# Altium footprint library Connector_Samtec_HLE_THT.PcbLib: 141 footprints (part 7 of 9) (continued)
## Samtec_HLE-138-02-xx-DV-PE_2x38_P2.54mm_Horizontal [mm]
pads (152):
  rrect19% 1.31x1.31 hole 0.71: 1(0,0)
  round 1.31 hole 0.71: 2(0,-7.62) 3(2.54,0) 4(2.54,-7.62) 5(5.08,0) 6(5.08,-7.62) 7(7.62,0) 8(7.62,-7.62) 9(10.16,0) 10(10.16,-7.62) 11(12.7,0) 12(12.7,-7.62) 13(15.24,0) 14(15.24,-7.62) 15(17.78,0) 16(17.78,-7.62) 17(20.32,0) 18(20.32,-7.62) 19(22.86,0) 20(22.86,-7.62) 21(25.4,0) 22(25.4,-7.62) 23(27.94,0) 24(27.94,-7.62) 25(30.48,0) 26(30.48,-7.62) 27(33.02,0) 28(33.02,-7.62) 29(35.56,0) 30(35.56,-7.62) 31(38.1,0) 32(38.1,-7.62) 33(40.64,0) 34(40.64,-7.62) 35(43.18,0) 36(43.18,-7.62) 37(45.72,0) 38(45.72,-7.62) 39(48.26,0) 40(48.26,-7.62) 41(50.8,0) 42(50.8,-7.62) 43(53.34,0) 44(53.34,-7.62) 45(55.88,0) 46(55.88,-7.62) 47(58.42,0) 48(58.42,-7.62) 49(60.96,0) 50(60.96,-7.62) 51(63.5,0) 52(63.5,-7.62) 53(66.04,0) 54(66.04,-7.62) 55(68.58,0) 56(68.58,-7.62) 57(71.12,0) 58(71.12,-7.62) 59(73.66,0) 60(73.66,-7.62) 61(76.2,0) 62(76.2,-7.62) 63(78.74,0) 64(78.74,-7.62) 65(81.28,0) 66(81.28,-7.62) 67(83.82,0) 68(83.82,-7.62) 69(86.36,0) 70(86.36,-7.62) 71(88.9,0) 72(88.9,-7.62) 73(91.44,0) 74(91.44,-7.62) 75(93.98,0) 76(93.98,-7.62)
  round 1.4 hole 1.4: Un1(60.96,-2.54) Un2(66.04,-5.08) Un3(17.78,-2.54) Un4(27.94,-2.54) Un5(53.34,-2.54) Un6(20.32,-5.08) Un7(40.64,-2.54) Un8(78.74,-2.54) Un9(35.56,-2.54) Un10(60.96,-5.08) Un11(93.98,-2.54) Un12(68.58,-2.54) Un13(22.86,-2.54) Un14(81.28,-5.08) Un15(22.86,-5.08) Un16(83.82,-2.54) Un17(27.94,-5.08) Un18(43.18,-2.54) Un19(53.34,-5.08) Un20(25.4,-2.54) Un21(2.54,-2.54) Un22(25.4,-5.08) Un23(10.16,-5.08) Un24(12.7,-5.08) Un25(15.24,-5.08) Un26(12.7,-2.54) Un27(45.72,-2.54) Un28(0,-5.08) Un29(30.48,-5.08) Un30(88.9,-5.08) Un31(93.98,-5.08) Un32(15.24,-2.54) Un33(68.58,-5.08) Un34(91.44,-2.54) Un35(17.78,-5.08) Un36(58.42,-5.08) Un37(48.26,-5.08) Un38(7.62,-5.08) Un39(66.04,-2.54) Un40(86.36,-5.08) Un41(63.5,-5.08) Un42(63.5,-2.54) Un43(78.74,-5.08) Un44(71.12,-2.54) Un45(71.12,-5.08) Un46(48.26,-2.54) Un47(86.36,-2.54) Un48(45.72,-5.08) Un49(76.2,-5.08) Un50(20.32,-2.54) Un51(5.08,-5.08) Un52(38.1,-2.54) Un53(43.18,-5.08) Un54(76.2,-2.54) Un55(55.88,-2.54) Un56(5.08,-2.54) Un57(0,-2.54) Un58(58.42,-2.54) Un59(40.64,-5.08) Un60(88.9,-2.54) Un61(38.1,-5.08) Un62(2.54,-5.08) Un63(50.8,-5.08) Un64(81.28,-2.54) Un65(35.56,-5.08) Un66(73.66,-5.08) Un67(50.8,-2.54) Un68(33.02,-2.54) Un69(30.48,-2.54) Un70(10.16,-2.54) Un71(55.88,-5.08) Un72(91.44,-5.08) Un73(7.62,-2.54) Un74(33.02,-5.08) Un75(83.82,-5.08) Un76(73.66,-2.54)
F.SilkS:
  lines w0.12: -1.38,-6.46 95.36,-6.46 95.36,-1.16 -1.38,-1.16 -1.38,-6.46
F.CrtYd:
  lines w0.05: -1.77,-8.78 95.75,-8.78 95.75,1.16 -1.77,1.16 -1.77,-8.78
F.Fab:
  lines w0.1: -0.5,-1.27 0,-1.977 0.5,-1.27 ; -1.27,-6.35 -1.27,-1.27 95.25,-1.27 95.25,-6.35 -1.27,-6.35
  text "'.Designator'" at 42.943,-6.49 h1

## Samtec_HLE-138-02-xx-DV-TE_2x38_P2.54mm_Horizontal [mm]
pads (76):
  rrect19% 1.31x1.31 hole 0.71: 1(0,0)
  round 1.31 hole 0.71: 2(0,-2.54) 3(2.54,0) 4(2.54,-2.54) 5(5.08,0) 6(5.08,-2.54) 7(7.62,0) 8(7.62,-2.54) 9(10.16,0) 10(10.16,-2.54) 11(12.7,0) 12(12.7,-2.54) 13(15.24,0) 14(15.24,-2.54) 15(17.78,0) 16(17.78,-2.54) 17(20.32,0) 18(20.32,-2.54) 19(22.86,0) 20(22.86,-2.54) 21(25.4,0) 22(25.4,-2.54) 23(27.94,0) 24(27.94,-2.54) 25(30.48,0) 26(30.48,-2.54) 27(33.02,0) 28(33.02,-2.54) 29(35.56,0) 30(35.56,-2.54) 31(38.1,0) 32(38.1,-2.54) 33(40.64,0) 34(40.64,-2.54) 35(43.18,0) 36(43.18,-2.54) 37(45.72,0) 38(45.72,-2.54) 39(48.26,0) 40(48.26,-2.54) 41(50.8,0) 42(50.8,-2.54) 43(53.34,0) 44(53.34,-2.54) 45(55.88,0) 46(55.88,-2.54) 47(58.42,0) 48(58.42,-2.54) 49(60.96,0) 50(60.96,-2.54) 51(63.5,0) 52(63.5,-2.54) 53(66.04,0) 54(66.04,-2.54) 55(68.58,0) 56(68.58,-2.54) 57(71.12,0) 58(71.12,-2.54) 59(73.66,0) 60(73.66,-2.54) 61(76.2,0) 62(76.2,-2.54) 63(78.74,0) 64(78.74,-2.54) 65(81.28,0) 66(81.28,-2.54) 67(83.82,0) 68(83.82,-2.54) 69(86.36,0) 70(86.36,-2.54) 71(88.9,0) 72(88.9,-2.54) 73(91.44,0) 74(91.44,-2.54) 75(93.98,0) 76(93.98,-2.54)
F.SilkS:
  lines w0.12: -1.38,-3.92 95.36,-3.92 95.36,1.38 -1.38,1.38 -1.38,-3.92
F.CrtYd:
  lines w0.05: -1.77,-4.31 95.75,-4.31 95.75,1.77 -1.77,1.77 -1.77,-4.31
F.Fab:
  lines w0.1: -0.5,1.27 0,0.563 0.5,1.27 ; -1.27,-3.81 -1.27,1.27 95.25,1.27 95.25,-3.81 -1.27,-3.81
  text "'.Designator'" at 42.943,-3.95 h1

## Samtec_HLE-139-02-xx-DV-PE-LC_2x39_P2.54mm_Horizontal [mm]
pads (158):
  rrect19% 1.31x1.31 hole 0.71: 1(0,0)
  round 1.31 hole 0.71: 2(0,-7.62) 3(2.54,0) 4(2.54,-7.62) 5(5.08,0) 6(5.08,-7.62) 7(7.62,0) 8(7.62,-7.62) 9(10.16,0) 10(10.16,-7.62) 11(12.7,0) 12(12.7,-7.62) 13(15.24,0) 14(15.24,-7.62) 15(17.78,0) 16(17.78,-7.62) 17(20.32,0) 18(20.32,-7.62) 19(22.86,0) 20(22.86,-7.62) 21(25.4,0) 22(25.4,-7.62) 23(27.94,0) 24(27.94,-7.62) 25(30.48,0) 26(30.48,-7.62) 27(33.02,0) 28(33.02,-7.62) 29(35.56,0) 30(35.56,-7.62) 31(38.1,0) 32(38.1,-7.62) 33(40.64,0) 34(40.64,-7.62) 35(43.18,0) 36(43.18,-7.62) 37(45.72,0) 38(45.72,-7.62) 39(48.26,0) 40(48.26,-7.62) 41(50.8,0) 42(50.8,-7.62) 43(53.34,0) 44(53.34,-7.62) 45(55.88,0) 46(55.88,-7.62) 47(58.42,0) 48(58.42,-7.62) 49(60.96,0) 50(60.96,-7.62) 51(63.5,0) 52(63.5,-7.62) 53(66.04,0) 54(66.04,-7.62) 55(68.58,0) 56(68.58,-7.62) 57(71.12,0) 58(71.12,-7.62) 59(73.66,0) 60(73.66,-7.62) 61(76.2,0) 62(76.2,-7.62) 63(78.74,0) 64(78.74,-7.62) 65(81.28,0) 66(81.28,-7.62) 67(83.82,0) 68(83.82,-7.62) 69(86.36,0) 70(86.36,-7.62) 71(88.9,0) 72(88.9,-7.62) 73(91.44,0) 74(91.44,-7.62) 75(93.98,0) 76(93.98,-7.62) 77(96.52,0) 78(96.52,-7.62)
  round 1.4 hole 1.4: Un1(73.66,-5.08) Un2(40.64,-5.08) Un3(55.88,-5.08) Un4(50.8,-5.08) Un5(76.2,-5.08) Un6(17.78,-2.54) Un7(66.04,-5.08) Un8(10.16,-5.08) Un9(20.32,-2.54) Un10(43.18,-2.54) Un11(35.56,-2.54) Un12(63.5,-5.08) Un13(45.72,-5.08) Un14(5.08,-2.54) Un15(71.12,-2.54) Un16(25.4,-5.08) Un17(81.28,-2.54) Un18(2.54,-2.54) Un19(91.44,-5.08) Un20(78.74,-2.54) Un21(2.54,-5.08) Un22(25.4,-2.54) Un23(5.08,-5.08) Un24(71.12,-5.08) Un25(10.16,-2.54) Un26(73.66,-2.54) Un27(12.7,-5.08) Un28(55.88,-2.54) Un29(7.62,-2.54) Un30(78.74,-5.08) Un31(60.96,-5.08) Un32(30.48,-5.08) Un33(15.24,-5.08) Un34(83.82,-5.08) Un35(38.1,-5.08) Un36(60.96,-2.54) Un37(45.72,-2.54) Un38(33.02,-2.54) Un39(83.82,-2.54) Un40(43.18,-5.08) Un41(53.34,-2.54) Un42(0,-2.54) Un43(68.58,-2.54) Un44(48.26,-5.08) Un45(27.94,-5.08) Un46(53.34,-5.08) Un47(58.42,-5.08) Un48(17.78,-5.08) Un49(58.42,-2.54) Un50(88.9,-2.54) Un51(50.8,-2.54) Un52(86.36,-5.08) Un53(40.64,-2.54) Un54(0,-5.08) Un55(96.52,-5.08) Un56(76.2,-2.54) Un57(96.52,-2.54) Un58(88.9,-5.08) Un59(30.48,-2.54) Un61(68.58,-5.08) Un62(7.62,-5.08) Un63(15.24,-2.54) Un65(38.1,-2.54) Un66(81.28,-5.08) Un67(48.26,-2.54) Un68(63.5,-2.54) Un69(20.32,-5.08) Un70(33.02,-5.08) Un71(27.94,-2.54) Un72(22.86,-2.54) Un73(93.98,-2.54) Un74(93.98,-5.08) Un75(66.04,-2.54) Un76(91.44,-2.54) Un77(22.86,-5.08) Un78(86.36,-2.54) Un79(12.7,-2.54) Un80(35.56,-5.08)
  round 1.19 hole 1.19: Un60(95.25,-3.81) Un64(1.27,-3.81)
F.SilkS:
  lines w0.12: -1.38,-6.46 97.9,-6.46 97.9,-1.16 -1.38,-1.16 -1.38,-6.46
F.CrtYd:
  lines w0.05: -1.77,-8.78 -1.77,1.16 98.29,1.16 98.29,-8.78 -1.77,-8.78
F.Fab:
  lines w0.1: -0.5,-1.27 0,-1.977 0.5,-1.27 ; -1.27,-6.35 -1.27,-1.27 97.79,-1.27 97.79,-6.35 -1.27,-6.35
  text "'.Designator'" at 44.213,-6.49 h1

## Samtec_HLE-139-02-xx-DV-PE_2x39_P2.54mm_Horizontal [mm]
pads (156):
  rrect19% 1.31x1.31 hole 0.71: 1(0,0)
  round 1.31 hole 0.71: 2(0,-7.62) 3(2.54,0) 4(2.54,-7.62) 5(5.08,0) 6(5.08,-7.62) 7(7.62,0) 8(7.62,-7.62) 9(10.16,0) 10(10.16,-7.62) 11(12.7,0) 12(12.7,-7.62) 13(15.24,0) 14(15.24,-7.62) 15(17.78,0) 16(17.78,-7.62) 17(20.32,0) 18(20.32,-7.62) 19(22.86,0) 20(22.86,-7.62) 21(25.4,0) 22(25.4,-7.62) 23(27.94,0) 24(27.94,-7.62) 25(30.48,0) 26(30.48,-7.62) 27(33.02,0) 28(33.02,-7.62) 29(35.56,0) 30(35.56,-7.62) 31(38.1,0) 32(38.1,-7.62) 33(40.64,0) 34(40.64,-7.62) 35(43.18,0) 36(43.18,-7.62) 37(45.72,0) 38(45.72,-7.62) 39(48.26,0) 40(48.26,-7.62) 41(50.8,0) 42(50.8,-7.62) 43(53.34,0) 44(53.34,-7.62) 45(55.88,0) 46(55.88,-7.62) 47(58.42,0) 48(58.42,-7.62) 49(60.96,0) 50(60.96,-7.62) 51(63.5,0) 52(63.5,-7.62) 53(66.04,0) 54(66.04,-7.62) 55(68.58,0) 56(68.58,-7.62) 57(71.12,0) 58(71.12,-7.62) 59(73.66,0) 60(73.66,-7.62) 61(76.2,0) 62(76.2,-7.62) 63(78.74,0) 64(78.74,-7.62) 65(81.28,0) 66(81.28,-7.62) 67(83.82,0) 68(83.82,-7.62) 69(86.36,0) 70(86.36,-7.62) 71(88.9,0) 72(88.9,-7.62) 73(91.44,0) 74(91.44,-7.62) 75(93.98,0) 76(93.98,-7.62) 77(96.52,0) 78(96.52,-7.62)
  round 1.4 hole 1.4: Un1(55.88,-2.54) Un2(50.8,-2.54) Un3(78.74,-2.54) Un4(96.52,-2.54) Un5(76.2,-5.08) Un6(7.62,-2.54) Un7(15.24,-5.08) Un8(25.4,-2.54) Un9(91.44,-2.54) Un10(83.82,-5.08) Un11(45.72,-2.54) Un12(15.24,-2.54) Un13(12.7,-5.08) Un14(86.36,-5.08) Un15(7.62,-5.08) Un16(27.94,-2.54) Un17(88.9,-5.08) Un18(71.12,-2.54) Un19(0,-2.54) Un20(73.66,-2.54) Un21(43.18,-2.54) Un22(12.7,-2.54) Un23(71.12,-5.08) Un24(81.28,-2.54) Un25(96.52,-5.08) Un26(38.1,-5.08) Un27(76.2,-2.54) Un28(66.04,-2.54) Un29(78.74,-5.08) Un30(25.4,-5.08) Un31(22.86,-2.54) Un32(10.16,-2.54) Un33(63.5,-5.08) Un34(53.34,-5.08) Un35(35.56,-5.08) Un36(40.64,-5.08) Un37(17.78,-2.54) Un38(60.96,-2.54) Un39(73.66,-5.08) Un40(48.26,-2.54) Un41(33.02,-5.08) Un42(17.78,-5.08) Un43(68.58,-5.08) Un44(55.88,-5.08) Un45(88.9,-2.54) Un46(58.42,-5.08) Un47(22.86,-5.08) Un48(2.54,-2.54) Un49(33.02,-2.54) Un50(66.04,-5.08) Un51(5.08,-2.54) Un52(20.32,-2.54) Un53(48.26,-5.08) Un54(38.1,-2.54) Un55(91.44,-5.08) Un56(60.96,-5.08) Un57(35.56,-2.54) Un58(93.98,-2.54) Un59(40.64,-2.54) Un60(58.42,-2.54) Un61(20.32,-5.08) Un62(50.8,-5.08) Un63(43.18,-5.08) Un64(45.72,-5.08) Un65(30.48,-2.54) Un66(10.16,-5.08) Un67(5.08,-5.08) Un68(27.94,-5.08) Un69(83.82,-2.54) Un70(68.58,-2.54) Un71(30.48,-5.08) Un72(53.34,-2.54) Un73(63.5,-2.54) Un74(86.36,-2.54) Un75(93.98,-5.08) Un76(0,-5.08) Un77(2.54,-5.08) Un78(81.28,-5.08)
F.SilkS:
  lines w0.12: -1.38,-6.46 97.9,-6.46 97.9,-1.16 -1.38,-1.16 -1.38,-6.46
F.CrtYd:
  lines w0.05: -1.77,-8.78 -1.77,1.16 98.29,1.16 98.29,-8.78 -1.77,-8.78
F.Fab:
  lines w0.1: -0.5,-1.27 0,-1.977 0.5,-1.27 ; -1.27,-6.35 97.79,-6.35 97.79,-1.27 -1.27,-1.27 -1.27,-6.35
  text "'.Designator'" at 44.213,-6.49 h1

## Samtec_HLE-139-02-xx-DV-TE_2x39_P2.54mm_Horizontal [mm]
pads (78):
  rrect19% 1.31x1.31 hole 0.71: 1(0,0)
  round 1.31 hole 0.71: 2(0,-2.54) 3(2.54,0) 4(2.54,-2.54) 5(5.08,0) 6(5.08,-2.54) 7(7.62,0) 8(7.62,-2.54) 9(10.16,0) 10(10.16,-2.54) 11(12.7,0) 12(12.7,-2.54) 13(15.24,0) 14(15.24,-2.54) 15(17.78,0) 16(17.78,-2.54) 17(20.32,0) 18(20.32,-2.54) 19(22.86,0) 20(22.86,-2.54) 21(25.4,0) 22(25.4,-2.54) 23(27.94,0) 24(27.94,-2.54) 25(30.48,0) 26(30.48,-2.54) 27(33.02,0) 28(33.02,-2.54) 29(35.56,0) 30(35.56,-2.54) 31(38.1,0) 32(38.1,-2.54) 33(40.64,0) 34(40.64,-2.54) 35(43.18,0) 36(43.18,-2.54) 37(45.72,0) 38(45.72,-2.54) 39(48.26,0) 40(48.26,-2.54) 41(50.8,0) 42(50.8,-2.54) 43(53.34,0) 44(53.34,-2.54) 45(55.88,0) 46(55.88,-2.54) 47(58.42,0) 48(58.42,-2.54) 49(60.96,0) 50(60.96,-2.54) 51(63.5,0) 52(63.5,-2.54) 53(66.04,0) 54(66.04,-2.54) 55(68.58,0) 56(68.58,-2.54) 57(71.12,0) 58(71.12,-2.54) 59(73.66,0) 60(73.66,-2.54) 61(76.2,0) 62(76.2,-2.54) 63(78.74,0) 64(78.74,-2.54) 65(81.28,0) 66(81.28,-2.54) 67(83.82,0) 68(83.82,-2.54) 69(86.36,0) 70(86.36,-2.54) 71(88.9,0) 72(88.9,-2.54) 73(91.44,0) 74(91.44,-2.54) 75(93.98,0) 76(93.98,-2.54) 77(96.52,0) 78(96.52,-2.54)
F.SilkS:
  lines w0.12: -1.38,-3.92 97.9,-3.92 97.9,1.38 -1.38,1.38 -1.38,-3.92
F.CrtYd:
  lines w0.05: -1.77,-4.31 98.29,-4.31 98.29,1.77 -1.77,1.77 -1.77,-4.31
F.Fab:
  lines w0.1: -0.5,1.27 0,0.563 0.5,1.27 ; -1.27,-3.81 -1.27,1.27 97.79,1.27 97.79,-3.81 -1.27,-3.81
  text "'.Designator'" at 44.213,-3.95 h1

## Samtec_HLE-140-02-xx-DV-PE-LC_2x40_P2.54mm_Horizontal [mm]
pads (162):
  rrect19% 1.31x1.31 hole 0.71: 1(0,0)
  round 1.31 hole 0.71: 2(0,-7.62) 3(2.54,0) 4(2.54,-7.62) 5(5.08,0) 6(5.08,-7.62) 7(7.62,0) 8(7.62,-7.62) 9(10.16,0) 10(10.16,-7.62) 11(12.7,0) 12(12.7,-7.62) 13(15.24,0) 14(15.24,-7.62) 15(17.78,0) 16(17.78,-7.62) 17(20.32,0) 18(20.32,-7.62) 19(22.86,0) 20(22.86,-7.62) 21(25.4,0) 22(25.4,-7.62) 23(27.94,0) 24(27.94,-7.62) 25(30.48,0) 26(30.48,-7.62) 27(33.02,0) 28(33.02,-7.62) 29(35.56,0) 30(35.56,-7.62) 31(38.1,0) 32(38.1,-7.62) 33(40.64,0) 34(40.64,-7.62) 35(43.18,0) 36(43.18,-7.62) 37(45.72,0) 38(45.72,-7.62) 39(48.26,0) 40(48.26,-7.62) 41(50.8,0) 42(50.8,-7.62) 43(53.34,0) 44(53.34,-7.62) 45(55.88,0) 46(55.88,-7.62) 47(58.42,0) 48(58.42,-7.62) 49(60.96,0) 50(60.96,-7.62) 51(63.5,0) 52(63.5,-7.62) 53(66.04,0) 54(66.04,-7.62) 55(68.58,0) 56(68.58,-7.62) 57(71.12,0) 58(71.12,-7.62) 59(73.66,0) 60(73.66,-7.62) 61(76.2,0) 62(76.2,-7.62) 63(78.74,0) 64(78.74,-7.62) 65(81.28,0) 66(81.28,-7.62) 67(83.82,0) 68(83.82,-7.62) 69(86.36,0) 70(86.36,-7.62) 71(88.9,0) 72(88.9,-7.62) 73(91.44,0) 74(91.44,-7.62) 75(93.98,0) 76(93.98,-7.62) 77(96.52,0) 78(96.52,-7.62) 79(99.06,0) 80(99.06,-7.62)
  round 1.4 hole 1.4: Un1(15.24,-5.08) Un2(83.82,-5.08) Un3(12.7,-2.54) Un4(10.16,-2.54) Un5(86.36,-2.54) Un6(81.28,-5.08) Un7(63.5,-5.08) Un8(99.06,-2.54) Un9(33.02,-2.54) Un10(12.7,-5.08) Un11(88.9,-2.54) Un12(78.74,-2.54) Un13(2.54,-2.54) Un14(53.34,-2.54) Un15(58.42,-2.54) Un16(81.28,-2.54) Un17(22.86,-5.08) Un18(66.04,-5.08) Un19(60.96,-5.08) Un20(71.12,-2.54) Un21(99.06,-5.08) Un22(91.44,-5.08) Un23(93.98,-5.08) Un24(78.74,-5.08) Un25(73.66,-2.54) Un26(5.08,-2.54) Un27(27.94,-2.54) Un28(30.48,-2.54) Un29(96.52,-2.54) Un30(0,-2.54) Un31(58.42,-5.08) Un32(40.64,-2.54) Un33(53.34,-5.08) Un34(83.82,-2.54) Un35(76.2,-2.54) Un36(76.2,-5.08) Un37(7.62,-2.54) Un38(20.32,-2.54) Un39(68.58,-2.54) Un41(22.86,-2.54) Un42(5.08,-5.08) Un44(27.94,-5.08) Un45(25.4,-5.08) Un46(45.72,-2.54) Un47(17.78,-2.54) Un48(96.52,-5.08) Un49(10.16,-5.08) Un50(73.66,-5.08) Un51(91.44,-2.54) Un52(38.1,-5.08) Un53(17.78,-5.08) Un54(55.88,-2.54) Un55(50.8,-2.54) Un56(38.1,-2.54) Un57(0,-5.08) Un58(55.88,-5.08) Un59(48.26,-5.08) Un60(40.64,-5.08) Un61(86.36,-5.08) Un62(48.26,-2.54) Un63(25.4,-2.54) Un64(35.56,-5.08) Un65(60.96,-2.54) Un66(71.12,-5.08) Un67(15.24,-2.54) Un68(30.48,-5.08) Un69(2.54,-5.08) Un70(50.8,-5.08) Un71(43.18,-2.54) Un72(63.5,-2.54) Un73(68.58,-5.08) Un74(66.04,-2.54) Un75(35.56,-2.54) Un76(33.02,-5.08) Un77(88.9,-5.08) Un78(93.98,-2.54) Un79(45.72,-5.08) Un80(20.32,-5.08) Un81(43.18,-5.08) Un82(7.62,-5.08)
  round 1.19 hole 1.19: Un40(1.27,-3.81) Un43(97.79,-3.81)
F.SilkS:
  lines w0.12: -1.38,-6.46 100.44,-6.46 100.44,-1.16 -1.38,-1.16 -1.38,-6.46
F.CrtYd:
  lines w0.05: -1.77,-8.78 100.83,-8.78 100.83,1.16 -1.77,1.16 -1.77,-8.78
F.Fab:
  lines w0.1: -0.5,-1.27 0,-1.977 0.5,-1.27 ; -1.27,-6.35 100.33,-6.35 100.33,-1.27 -1.27,-1.27 -1.27,-6.35
  text "'.Designator'" at 45.483,-6.49 h1

## Samtec_HLE-140-02-xx-DV-PE_2x40_P2.54mm_Horizontal [mm]
pads (160):
  rrect19% 1.31x1.31 hole 0.71: 1(0,0)
  round 1.31 hole 0.71: 2(0,-7.62) 3(2.54,0) 4(2.54,-7.62) 5(5.08,0) 6(5.08,-7.62) 7(7.62,0) 8(7.62,-7.62) 9(10.16,0) 10(10.16,-7.62) 11(12.7,0) 12(12.7,-7.62) 13(15.24,0) 14(15.24,-7.62) 15(17.78,0) 16(17.78,-7.62) 17(20.32,0) 18(20.32,-7.62) 19(22.86,0) 20(22.86,-7.62) 21(25.4,0) 22(25.4,-7.62) 23(27.94,0) 24(27.94,-7.62) 25(30.48,0) 26(30.48,-7.62) 27(33.02,0) 28(33.02,-7.62) 29(35.56,0) 30(35.56,-7.62) 31(38.1,0) 32(38.1,-7.62) 33(40.64,0) 34(40.64,-7.62) 35(43.18,0) 36(43.18,-7.62) 37(45.72,0) 38(45.72,-7.62) 39(48.26,0) 40(48.26,-7.62) 41(50.8,0) 42(50.8,-7.62) 43(53.34,0) 44(53.34,-7.62) 45(55.88,0) 46(55.88,-7.62) 47(58.42,0) 48(58.42,-7.62) 49(60.96,0) 50(60.96,-7.62) 51(63.5,0) 52(63.5,-7.62) 53(66.04,0) 54(66.04,-7.62) 55(68.58,0) 56(68.58,-7.62) 57(71.12,0) 58(71.12,-7.62) 59(73.66,0) 60(73.66,-7.62) 61(76.2,0) 62(76.2,-7.62) 63(78.74,0) 64(78.74,-7.62) 65(81.28,0) 66(81.28,-7.62) 67(83.82,0) 68(83.82,-7.62) 69(86.36,0) 70(86.36,-7.62) 71(88.9,0) 72(88.9,-7.62) 73(91.44,0) 74(91.44,-7.62) 75(93.98,0) 76(93.98,-7.62) 77(96.52,0) 78(96.52,-7.62) 79(99.06,0) 80(99.06,-7.62)
  round 1.4 hole 1.4: Un1(7.62,-2.54) Un2(83.82,-5.08) Un3(93.98,-5.08) Un4(27.94,-5.08) Un5(33.02,-2.54) Un6(22.86,-5.08) Un7(83.82,-2.54) Un8(60.96,-5.08) Un9(17.78,-2.54) Un10(20.32,-5.08) Un11(63.5,-5.08) Un12(71.12,-2.54) Un13(55.88,-5.08) Un14(35.56,-5.08) Un15(93.98,-2.54) Un16(43.18,-2.54) Un17(25.4,-5.08) Un18(25.4,-2.54) Un19(91.44,-5.08) Un20(58.42,-2.54) Un21(2.54,-2.54) Un22(86.36,-5.08) Un23(2.54,-5.08) Un24(12.7,-2.54) Un25(91.44,-2.54) Un26(68.58,-5.08) Un27(15.24,-2.54) Un28(99.06,-2.54) Un29(12.7,-5.08) Un30(73.66,-2.54) Un31(43.18,-5.08) Un32(50.8,-5.08) Un33(38.1,-2.54) Un34(66.04,-2.54) Un35(81.28,-2.54) Un36(10.16,-2.54) Un37(17.78,-5.08) Un38(86.36,-2.54) Un39(78.74,-2.54) Un40(55.88,-2.54) Un41(58.42,-5.08) Un42(68.58,-2.54) Un43(40.64,-2.54) Un44(0,-2.54) Un45(99.06,-5.08) Un46(76.2,-2.54) Un47(15.24,-5.08) Un48(73.66,-5.08) Un49(53.34,-5.08) Un50(66.04,-5.08) Un51(20.32,-2.54) Un52(88.9,-5.08) Un53(45.72,-5.08) Un54(0,-5.08) Un55(40.64,-5.08) Un56(71.12,-5.08) Un57(76.2,-5.08) Un58(78.74,-5.08) Un59(50.8,-2.54) Un60(63.5,-2.54) Un61(48.26,-2.54) Un62(38.1,-5.08) Un63(30.48,-2.54) Un64(48.26,-5.08) Un65(96.52,-5.08) Un66(30.48,-5.08) Un67(27.94,-2.54) Un68(45.72,-2.54) Un69(53.34,-2.54) Un70(10.16,-5.08) Un71(33.02,-5.08) Un72(5.08,-5.08) Un73(5.08,-2.54) Un74(7.62,-5.08) Un75(35.56,-2.54) Un76(88.9,-2.54) Un77(81.28,-5.08) Un78(22.86,-2.54) Un79(96.52,-2.54) Un80(60.96,-2.54)
F.SilkS:
  lines w0.12: -1.38,-6.46 100.44,-6.46 100.44,-1.16 -1.38,-1.16 -1.38,-6.46
F.CrtYd:
  lines w0.05: -1.77,-8.78 100.83,-8.78 100.83,1.16 -1.77,1.16 -1.77,-8.78
F.Fab:
  lines w0.1: -0.5,-1.27 0,-1.977 0.5,-1.27 ; -1.27,-6.35 100.33,-6.35 100.33,-1.27 -1.27,-1.27 -1.27,-6.35
  text "'.Designator'" at 45.483,-6.49 h1

## Samtec_HLE-140-02-xx-DV-TE_2x40_P2.54mm_Horizontal [mm]
pads (80):
  rrect19% 1.31x1.31 hole 0.71: 1(0,0)
  round 1.31 hole 0.71: 2(0,-2.54) 3(2.54,0) 4(2.54,-2.54) 5(5.08,0) 6(5.08,-2.54) 7(7.62,0) 8(7.62,-2.54) 9(10.16,0) 10(10.16,-2.54) 11(12.7,0) 12(12.7,-2.54) 13(15.24,0) 14(15.24,-2.54) 15(17.78,0) 16(17.78,-2.54) 17(20.32,0) 18(20.32,-2.54) 19(22.86,0) 20(22.86,-2.54) 21(25.4,0) 22(25.4,-2.54) 23(27.94,0) 24(27.94,-2.54) 25(30.48,0) 26(30.48,-2.54) 27(33.02,0) 28(33.02,-2.54) 29(35.56,0) 30(35.56,-2.54) 31(38.1,0) 32(38.1,-2.54) 33(40.64,0) 34(40.64,-2.54) 35(43.18,0) 36(43.18,-2.54) 37(45.72,0) 38(45.72,-2.54) 39(48.26,0) 40(48.26,-2.54) 41(50.8,0) 42(50.8,-2.54) 43(53.34,0) 44(53.34,-2.54) 45(55.88,0) 46(55.88,-2.54) 47(58.42,0) 48(58.42,-2.54) 49(60.96,0) 50(60.96,-2.54) 51(63.5,0) 52(63.5,-2.54) 53(66.04,0) 54(66.04,-2.54) 55(68.58,0) 56(68.58,-2.54) 57(71.12,0) 58(71.12,-2.54) 59(73.66,0) 60(73.66,-2.54) 61(76.2,0) 62(76.2,-2.54) 63(78.74,0) 64(78.74,-2.54) 65(81.28,0) 66(81.28,-2.54) 67(83.82,0) 68(83.82,-2.54) 69(86.36,0) 70(86.36,-2.54) 71(88.9,0) 72(88.9,-2.54) 73(91.44,0) 74(91.44,-2.54) 75(93.98,0) 76(93.98,-2.54) 77(96.52,0) 78(96.52,-2.54) 79(99.06,0) 80(99.06,-2.54)
F.SilkS:
  lines w0.12: -1.38,-3.92 -1.38,1.38 100.44,1.38 100.44,-3.92 -1.38,-3.92
F.CrtYd:
  lines w0.05: -1.77,-4.31 100.83,-4.31 100.83,1.77 -1.77,1.77 -1.77,-4.31
F.Fab:
  lines w0.1: -0.5,1.27 0,0.563 0.5,1.27 ; -1.27,-3.81 100.33,-3.81 100.33,1.27 -1.27,1.27 -1.27,-3.81
  text "'.Designator'" at 45.483,-3.95 h1

## Samtec_HLE-141-02-xx-DV-PE-LC_2x41_P2.54mm_Horizontal [mm]
pads (166):
  rrect19% 1.31x1.31 hole 0.71: 1(0,0)
  round 1.31 hole 0.71: 2(0,-7.62) 3(2.54,0) 4(2.54,-7.62) 5(5.08,0) 6(5.08,-7.62) 7(7.62,0) 8(7.62,-7.62) 9(10.16,0) 10(10.16,-7.62) 11(12.7,0) 12(12.7,-7.62) 13(15.24,0) 14(15.24,-7.62) 15(17.78,0) 16(17.78,-7.62) 17(20.32,0) 18(20.32,-7.62) 19(22.86,0) 20(22.86,-7.62) 21(25.4,0) 22(25.4,-7.62) 23(27.94,0) 24(27.94,-7.62) 25(30.48,0) 26(30.48,-7.62) 27(33.02,0) 28(33.02,-7.62) 29(35.56,0) 30(35.56,-7.62) 31(38.1,0) 32(38.1,-7.62) 33(40.64,0) 34(40.64,-7.62) 35(43.18,0) 36(43.18,-7.62) 37(45.72,0) 38(45.72,-7.62) 39(48.26,0) 40(48.26,-7.62) 41(50.8,0) 42(50.8,-7.62) 43(53.34,0) 44(53.34,-7.62) 45(55.88,0) 46(55.88,-7.62) 47(58.42,0) 48(58.42,-7.62) 49(60.96,0) 50(60.96,-7.62) 51(63.5,0) 52(63.5,-7.62) 53(66.04,0) 54(66.04,-7.62) 55(68.58,0) 56(68.58,-7.62) 57(71.12,0) 58(71.12,-7.62) 59(73.66,0) 60(73.66,-7.62) 61(76.2,0) 62(76.2,-7.62) 63(78.74,0) 64(78.74,-7.62) 65(81.28,0) 66(81.28,-7.62) 67(83.82,0) 68(83.82,-7.62) 69(86.36,0) 70(86.36,-7.62) 71(88.9,0) 72(88.9,-7.62) 73(91.44,0) 74(91.44,-7.62) 75(93.98,0) 76(93.98,-7.62) 77(96.52,0) 78(96.52,-7.62) 79(99.06,0) 80(99.06,-7.62) 81(101.6,0) 82(101.6,-7.62)
  round 1.4 hole 1.4: Un1(20.32,-2.54) Un3(15.24,-5.08) Un4(40.64,-5.08) Un5(68.58,-2.54) Un6(0,-5.08) Un7(88.9,-5.08) Un8(88.9,-2.54) Un9(81.28,-2.54) Un10(30.48,-5.08) Un11(66.04,-5.08) Un12(20.32,-5.08) Un13(93.98,-2.54) Un14(83.82,-5.08) Un15(53.34,-2.54) Un16(63.5,-5.08) Un17(68.58,-5.08) Un18(12.7,-5.08) Un19(10.16,-2.54) Un20(45.72,-5.08) Un21(7.62,-5.08) Un22(96.52,-5.08) Un23(58.42,-2.54) Un24(43.18,-5.08) Un25(7.62,-2.54) Un26(76.2,-2.54) Un27(58.42,-5.08) Un28(33.02,-2.54) Un29(60.96,-5.08) Un30(27.94,-5.08) Un31(22.86,-2.54) Un32(81.28,-5.08) Un33(76.2,-5.08) Un34(5.08,-5.08) Un35(93.98,-5.08) Un36(73.66,-5.08) Un37(2.54,-2.54) Un38(40.64,-2.54) Un39(33.02,-5.08) Un40(35.56,-5.08) Un41(0,-2.54) Un42(96.52,-2.54) Un43(45.72,-2.54) Un44(10.16,-5.08) Un45(86.36,-5.08) Un46(78.74,-5.08) Un47(38.1,-2.54) Un48(2.54,-5.08) Un49(50.8,-2.54) Un50(71.12,-2.54) Un51(78.74,-2.54) Un52(60.96,-2.54) Un53(101.6,-5.08) Un54(17.78,-5.08) Un55(48.26,-2.54) Un56(86.36,-2.54) Un57(71.12,-5.08) Un58(101.6,-2.54) Un59(27.94,-2.54) Un60(50.8,-5.08) Un61(99.06,-2.54) Un62(5.08,-2.54) Un63(48.26,-5.08) Un64(38.1,-5.08) Un65(25.4,-2.54) Un66(22.86,-5.08) Un67(30.48,-2.54) Un68(12.7,-2.54) Un69(55.88,-5.08) Un70(63.5,-2.54) Un71(55.88,-2.54) Un72(91.44,-5.08) Un73(99.06,-5.08) Un74(35.56,-2.54) Un75(17.78,-2.54) Un76(73.66,-2.54) Un77(15.24,-2.54) Un78(53.34,-5.08) Un79(25.4,-5.08) Un81(43.18,-2.54) Un82(66.04,-2.54) Un83(91.44,-2.54) Un84(83.82,-2.54)
  round 1.19 hole 1.19: Un2(1.27,-3.81) Un80(100.33,-3.81)
F.SilkS:
  lines w0.12: -1.38,-6.46 102.98,-6.46 102.98,-1.16 -1.38,-1.16 -1.38,-6.46
F.CrtYd:
  lines w0.05: -1.77,-8.78 -1.77,1.16 103.37,1.16 103.37,-8.78 -1.77,-8.78
F.Fab:
  lines w0.1: -0.5,-1.27 0,-1.977 0.5,-1.27 ; -1.27,-6.35 102.87,-6.35 102.87,-1.27 -1.27,-1.27 -1.27,-6.35
  text "'.Designator'" at 46.753,-6.49 h1